# Altium integrated library ADLib_GoodToUse.IntLib: 276 symbols (part 1 of 2) (continued)
## SBD_SOD323
designator D?, comment SBD
Schottky Diode; Mfr_Name: Mfr?; Package: SOD323; PartNumber: SBD
footprint SOD-323_L1.7-W1.3-RD
pins: 1, 2

## TVS_0603_BD
designator D?, comment TVS
TVS Diode Bidirectional; Mfr_Name: Mfr?; Package: 0603; PartNumber: TVS
footprint L0603
pins: 1 A, 2 K

## TVS_Diode_BD
designator D?, comment TVS
TVS Diode Bidirectional; Mfr_Name: Mfr?; Package: PkgRef; PartNumber: TVS
footprint DO-214AA_L5.3-W3.6-RD (SMB)
pins: 1 A, 2 K

## TVS_Diode_UD
designator D?, comment TVS
TVS Diode Uni-directional; Mfr_Name: Mfr?; Package: PkgRef; PartNumber: TVS
footprint DO-214AA_L5.3-W3.6-RD (SMB)
pins: 1, 2


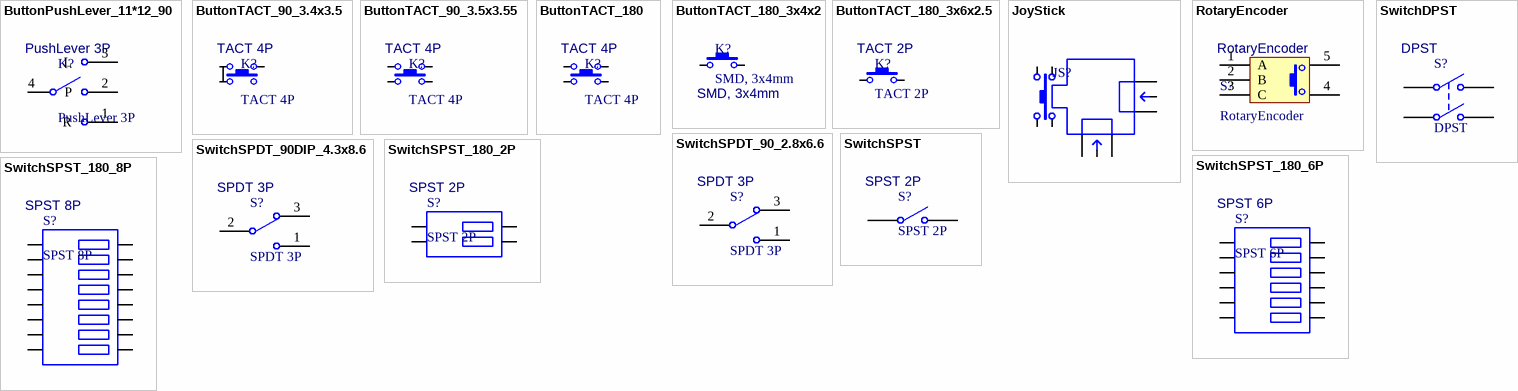
[diagram p6: symbols ButtonPushLever_11*12_90 to SwitchSPST_180_8P]

## ButtonPushLever_11*12_90
designator K?, comment PushLever 3P
Button; type: PushLever 3P; PartNumber: PushLever 3P
footprint ButtonPushLever_11*12_90
pins: 1 R  , 2 P  , 3 L  , 4

## ButtonTACT_90_3.4x3.5
designator K?, comment TACT 4P
Button; type: TACT 4P; Link: *; PartNumber: TACT 4P
footprint ButtonTACT_3.4*3.5_90
pins: 1, 2, 3

## ButtonTACT_90_3.5x3.55
designator K?, comment TACT 4P
Button; type: TACT 4P; Link: *; PartNumber: TACT 4P
footprint ButtonTACT_3.5*3.55_90
pins: 1, 2, 3, 4

## ButtonTACT_180
designator K?, comment TACT 4P
Button; type: TACT 4P; PartNumber: TACT 4P
footprint ButtonTACT_4P_3x4x2_180
pins: 1, 2, 3, 4

## ButtonTACT_180_3x4x2
designator K?, comment SMD, 3x4mm
Button; type: SMD, 3x4mm; MFR: SMD, 3x4mm; PartNumber: SMD, 3x4mm
footprint ButtonTACT_3x4x2_180
footprint ButtonTACT_3x4x2_180H
pins: 1, 2

## ButtonTACT_180_3x6x2.5
designator K?, comment TACT 2P
Button; type: TACT 2P; PartNumber: TACT 2P
footprint ButtonTACT_3x6x2.5_180
pins: 1, 2

## JoyStick
designator JS?
JoyStick; Package: *
footprint JoyStick
pins: 1, 2, 3, 4, 5, 6, 7, 8, 9, 10

## RotaryEncoder
designator S?
Encoder; Package: RotaryEncoder; PartNumber: RotaryEncoder
footprint RotaryEncoder
pins: 1 A, 2 B, 3 C, 4, 5

## SwitchDPST
designator S?, comment DPST
Switch; Package: DPST; PartNumber: DPST
footprint DPST-4 (Switch; 4 Leads)
pins: 1 COMMON1, 2 NO1, 3 COMMON2, 4 NO2

## SwitchSPDT_90_2.8x6.6
designator S?, comment SPDT 3P
Switch; Package: SPDT 3P; Link: *; PartNumber: SPDT 3P
footprint SwitchSPDT_2.8X6.6_90
pins: 1, 2, 3

## SwitchSPDT_90DIP_4.3x8.6
designator S?, comment SPDT 3P
Switch; Package: SPDT 3P; PartNumber: SPDT 3P
footprint SwitchSPDT_4.3X8.6_D90
pins: 1, 2, 3

## SwitchSPST
designator S?, comment SPST 2P
Switch; Package: SPST 2P; PartNumber: SPST 2P
footprint SPST-2 (Switch; 2 Leads)
pins: 1 COMMON, 2 NO

## SwitchSPST_180_2P
designator S?, comment SPST 2P
Switch; Package: SPST 2P; PartNumber: SPST 2P
footprint SwitchSPDT_P2_180
pins: 1 COMMON, 1ON ON, 2 COMMON, 2ON NO

## SwitchSPST_180_6P
designator S?, comment SPST 6P
Switch; Package: SPST 6P; PartNumber: SPST 6P
footprint SwitchSPDT_P6_180
pins: 1 COMMON, 1ON ON, 2 COMMON, 2ON NO, 3 COMMON, 3ON NO, 4 COMMON, 4ON NO, 5 COMMON, 5ON NO, 6 COMMON, 6ON NO

## SwitchSPST_180_8P
designator S?, comment SPST 8P
Switch; Package: SPST 8P; PartNumber: SPST 8P
footprint SwitchSPDT_P8_180
pins: 1 COMMON, 1ON ON, 2 COMMON, 2ON NO, 3 COMMON, 3ON NO, 4 COMMON, 4ON NO, 5 COMMON, 5ON NO, 6 COMMON, 6ON NO, 7 COMMON, 7ON NO, 8 COMMON, 8ON NO


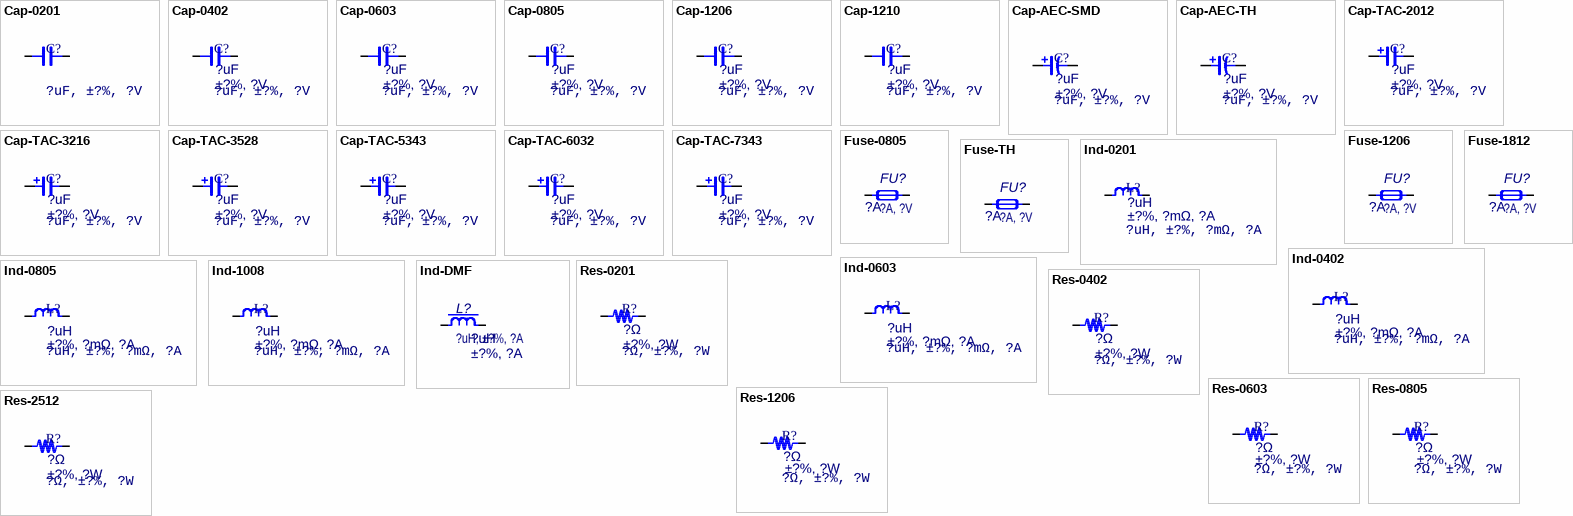
[diagram p7: symbols Cap-0201 to Res-2512]

## Cap-0201
designator C?, comment ?uF, ±?%, ?V
Capacitor; MFR: Mfr?; PartNumber: C0201; Note: ±?%, ?V; Package: 0201; Value: ?uF
footprint C0201
pins: 1, 2

## Cap-0402
designator C?, comment ?uF, ±?%, ?V  value ?uF  Note: ±?%, ?V
Capacitor; MFR: Mfr?; PartNumber: C0402; Package: 0402
footprint C0402
pins: 1, 2

## Cap-0603
designator C?, comment ?uF, ±?%, ?V  value ?uF  Note: ±?%, ?V
Capacitor; MFR: Mfr?; PartNumber: C0603; Package: 0603
footprint C0603
pins: 1, 2

## Cap-0805
designator C?, comment ?uF, ±?%, ?V  value ?uF  Note: ±?%, ?V
Capacitor; MFR: Mfr?; PartNumber: C0805; Package: 0805
footprint C0805
pins: 1, 2

## Cap-1206
designator C?, comment ?uF, ±?%, ?V  value ?uF  Note: ±?%, ?V
Capacitor; MFR: Mfr?; PartNumber: C1206; Package: 1206
footprint C1206
pins: 1, 2

## Cap-1210
designator C?, comment ?uF, ±?%, ?V  value ?uF  Note: ±?%, ?V
Capacitor; MFR: Mfr?; PartNumber: C1210; Package: 1210
footprint C1210
pins: 1, 2

## Cap-AEC-SMD
designator C?, comment ?uF, ±?%, ?V  value ?uF  Note: ±?%, ?V
Capacitor AEC; MFR: Mfr?; Package: AEC-SMD; PartNumber: AEC
footprint AEC-SMD_BD3.0-L3.3-W3.3-FD (贴片电解电容，直径3mm，高5.4mm)
footprint AEC-SMD_BD4.0-L4.3-W4.3-FD (贴片电解电容，直径4mm，高5.4mm)
footprint AEC-SMD_BD5.0-L5.3-W5.3-FD (贴片电解电容，直径5mm，高5.4mm)
footprint AEC-SMD_BD6.3-L6.6-W6.6-FD
footprint AEC-SMD_BD8.0-L8.3-W8.3-FD (贴片电解电容，直径8mm，高6.2mm)
footprint AEC-SMD_BD10.0-L10.3-W10.3-FD (贴片电解电容，直径10mm，高10.2mm)
footprint AEC-SMD_BD12.5-L13.0-W13.0-FD (贴片电解电容，直径12.5mm，高13.5mm)
footprint AEC-SMD_BD16.0-L17.0-W17.0-FD (贴片电解电容，直径16mm，高16.5mm)
pins: 1, 2

## Cap-AEC-TH
designator C?, comment ?uF, ±?%, ?V  value ?uF  Note: ±?%, ?V
Capacitor AEC; MFR: Mfr?; Package: AEC-SMD; PartNumber: AEC
footprint AEC-TH_BD4.0-P1.50-FD (脚距1.5mm直径4mm高度8mm)
pins: 1, 2

## Cap-TAC-2012
designator C?, comment ?uF, ±?%, ?V  value ?uF  Note: ±?%, ?V
Capacitor Tantalum; MFR: Mfr?; PartNumber: TAC0805; Package: 0805
footprint TAC-SMD_2012-FD_0805
pins: 1, 2

## Cap-TAC-3216
designator C?, comment ?uF, ±?%, ?V  value ?uF  Note: ±?%, ?V
Capacitor Tantalum; MFR: Mfr?; PartNumber: TAC1210; Package: 1210
footprint TAC-SMD_3216-FD_1206
pins: 1, 2

## Cap-TAC-3528
designator C?, comment ?uF, ±?%, ?V  value ?uF  Note: ±?%, ?V
Capacitor Tantalum; MFR: Mfr?; PartNumber: TAC1206; Package: 1206
footprint TAC-SMD_3528-FD_1210
pins: 1, 2

## Cap-TAC-5343
designator C?, comment ?uF, ±?%, ?V  value ?uF  Note: ±?%, ?V
Capacitor Tantalum; MFR: Mfr?; PartNumber: TAC2917; Package: 2917
footprint TAC-SMD_5343 (长7.3mm，宽4.3mm，厚2.8mm)
pins: 1, 2

## Cap-TAC-6032
designator C?, comment ?uF, ±?%, ?V  value ?uF  Note: ±?%, ?V
Capacitor Tantalum; MFR: Mfr?; PartNumber: TAC2917; Package: 2917
footprint TAC-SMD_6032 (长6.0mm，宽3.2mm，厚2.5mm)
pins: 1, 2

## Cap-TAC-7343
designator C?, comment ?uF, ±?%, ?V  value ?uF  Note: ±?%, ?V
Capacitor Tantalum; MFR: Mfr?; PartNumber: TAC2917; Package: 2917
footprint TAC-SMD_7343-FD_2917
pins: 1, 2

## Fuse-0805
designator FU?, comment ?A, ?V  value ?A
Self recovery fuse PPTC; MFR: Mfr?; PartNumber: FU0805; Package: 0805; Note: ?V
footprint F0805
pins: 1, 2

## Fuse-1206
designator FU?, comment ?A, ?V  value ?A
Self recovery fuse PPTC; MFR: Mfr?; PartNumber: FU1206; Package: 1206; Note: ?V
footprint F1206
pins: 1, 2

## Fuse-1812
designator FU?, comment ?A, ?V  value ?A
Self recovery fuse PPTC; MFR: Mfr?; PartNumber: FU1812; Package: 1812; Note: ?V
footprint F1812
pins: 1, 2

## Fuse-TH
designator FU?, comment ?A, ?V  value ?A
Self recovery fuse PPTC; MFR: Mfr?; PartNumber: FU; Package: DIPx2; Note: ?V
footprint FUSE-TH_L16.0-W4.0-P6.0-V (4*16mm(直径，脚距）)
pins: 1, 2

## Ind-0201
designator L?, comment ?uH, ±?%, ?mΩ, ?A  value ?uH  Note: ±?%, ?mΩ, ?A
Inductor; MFR: Mfr?; PartNumber: L0201; Package: 0201
pins: 1, 2

## Ind-0402
designator L?, comment ?uH, ±?%, ?mΩ, ?A  value ?uH  Note: ±?%, ?mΩ, ?A
Inductor; MFR: Mfr?; PartNumber: L0402; Package: 0402
footprint L0402
pins: 1, 2

## Ind-0603
designator L?, comment ?uH, ±?%, ?mΩ, ?A  value ?uH  Note: ±?%, ?mΩ, ?A
Inductor; MFR: Mfr?; PartNumber: L0603; Package: 0603
footprint L0603
pins: 1, 2

## Ind-0805
designator L?, comment ?uH, ±?%, ?mΩ, ?A  value ?uH  Note: ±?%, ?mΩ, ?A
Inductor; MFR: Mfr?; PartNumber: L0805; Package: 0805
footprint L0805
pins: 1, 2

## Ind-1008
designator L?, comment ?uH, ±?%, ?mΩ, ?A  value ?uH  Note: ±?%, ?mΩ, ?A
Inductor; MFR: Mfr?; PartNumber: L1008; Package: 1008
pins: 1, 2

## Ind-DMF
designator L?, comment ?uH, ±?%, ?A  value ?uH  Note: ±?%, ?A
Differential mode filtering inductance; MFR: Mfr?; PartNumber: L; Package: pkg?
footprint IND-SMD_L4.0-W4.0_NR4010 (4.0mm*4.0mm*1.0mm(长*宽*高）)
pins: 1, 2

## Res-0201
designator R?, comment ?Ω, ±?%, ?W  value ?Ω  Note: ±?%, ?W
Resistor; MFR: Mfr?; PartNumber: R0201; Package: 0201
pins: 1, 2

## Res-0402
designator R?, comment ?Ω, ±?%, ?W  value ?Ω  Note: ±?%, ?W
Resistor; MFR: Mfr?; PartNumber: R0402; Package: 0402
footprint R0402
pins: 1, 2

## Res-0603
designator R?, comment ?Ω, ±?%, ?W  value ?Ω  Note: ±?%, ?W
Resistor; MFR: Mfr?; PartNumber: R0603; Package: 0603
footprint R0603
pins: 1, 2

## Res-0805
designator R?, comment ?Ω, ±?%, ?W  value ?Ω  Note: ±?%, ?W
Resistor; MFR: Mfr?; PartNumber: R0805; Package: 0805
footprint R0805
pins: 1, 2

## Res-1206
designator R?, comment ?Ω, ±?%, ?W  value ?Ω  Note: ±?%, ?W
Resistor; MFR: Mfr?; PartNumber: R1206; Package: 1206
footprint R1206
pins: 1, 2

## Res-2512
designator R?, comment ?Ω, ±?%, ?W  value ?Ω  Note: ±?%, ?W
Resistor; MFR: Mfr?; PartNumber: R2512; Package: 2512
footprint R2512
pins: 1, 2


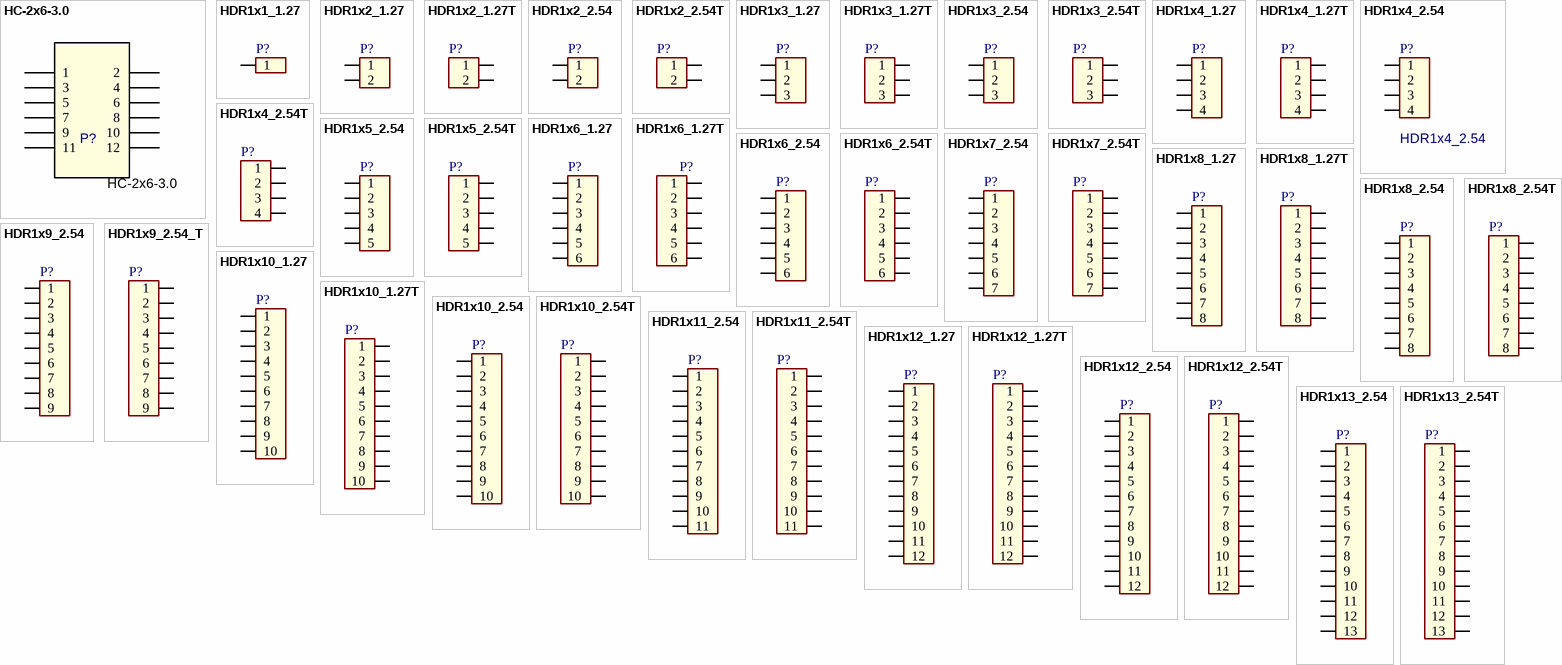
[diagram p8: symbols HC-2x6-3.0 to HDR1x13_2.54T]

## HC-2x6-3.0
designator P?
Header; MFR: Mfr?; Package: HC-2x6-3.0; PartNumber: HC-2x6-3.0
footprint MX-TH_2X6P-P3.0_MX3.0-2X6AW
pins: 1, 2, 3, 4, 5, 6, 7, 8, 9, 10, 11, 12

## HDR1x1_1.27
designator P?, comment HDR1x1  (value not drawn)
Header; PartNumber: HDR1x1_1.27; Package: HDR1x1_1.27
footprint HDR-TH-1P-P1.27-V
pins: 1

## HDR1x2_1.27
designator P?, comment HDR1x2  (value not drawn)
Header; PartNumber: HDR1x2_1.27; Package: HDR1x2_1.27
footprint HDR-TH-1X2P-P2.54-H
footprint HDR-TH-1X2P-P1.27-V
pins: 1, 2

## HDR1x2_1.27T
designator P?, comment HDR1x2  (value not drawn)
Header; PartNumber: HDR1x2_1.27T; Package: HDR1x2_1.27T
footprint HDR1X2_1.27_180
footprint HDR1X2_1.27_180H
pins: 1, 2

## HDR1x2_2.54
designator P?, comment HDR1x2  (value not drawn)
Header; PartNumber: HDR1x2_2.54; Package: HDR1x2_2.54
footprint HDR1X2_2.54_90
footprint HDR1X2_2.54_90F
footprint HDR1X2_2.54_180
footprint HDR1X2_2.54_180F
footprint HDR1X2_2.54_180H
footprint HDR1X2_2.54_180HD
pins: 1, 2

## HDR1x2_2.54T
designator P?, comment HDR1x2  (value not drawn)
Header; PartNumber: HDR1x2_2.54T; Package: HDR1x2_2.54T
footprint HDR1X2_2.54_90
footprint HDR1X2_2.54_90F
footprint HDR1X2_2.54_180
footprint HDR1X2_2.54_180F
footprint HDR1X2_2.54_180H
footprint HDR1X2_2.54_180HD
pins: 1, 2

## HDR1x3_1.27
designator P?, comment HDR1x3  (value not drawn)
Header; PartNumber: HDR1x3_1.27; Package: HDR1x3_1.27
footprint HDR1X3_1.27_180HF
pins: 1, 2, 3

## HDR1x3_1.27T
designator P?, comment HDR1x3  (value not drawn)
Header; PartNumber: HDR1x3_1.27T; Package: HDR1x3_1.27T
footprint HDR1X3_1.27_180 (Footprint not found)
footprint HDR1X3_1.27_180HF
pins: 1, 2, 3

## HDR1x3_2.54
designator P?, comment HDR1x3  (value not drawn)
Header; PartNumber: HDR1x3_2.54; Package: HDR1x3_2.54
footprint HDR1X3_2.54_90
footprint HDR1X3_2.54_90F
footprint HDR1X3_2.54_180
footprint HDR1X3_2.54_180F
pins: 1, 2, 3

## HDR1x3_2.54T
designator P?, comment HDR1x3  (value not drawn)
Header; PartNumber: HDR1x3_2.54T; Package: HDR1x3_2.54T
footprint HDR1X3_2.54_90
footprint HDR1X3_2.54_90F
footprint HDR1X3_2.54_180
footprint HDR1X3_2.54_180F
pins: 1, 2, 3

## HDR1x4_1.27
designator P?, comment HDR1x4  (value not drawn)
Header; PartNumber: HDR1x4_1.27; Package: HDR1x4_1.27
footprint HDR1X4_1.27_180
footprint HDR1X4_1.27_180F
footprint HDR1X4_1.27_180H
footprint HDR1X4_1.27_180HF
pins: 1, 2, 3, 4

## HDR1x4_1.27T
designator P?, comment HDR1x4  (value not drawn)
Header; PartNumber: HDR1x4_1.27T; Package: HDR1x4_1.27T
footprint HDR1X4_1.27_180
footprint HDR1X4_1.27_180F
footprint HDR1X4_1.27_180H
footprint HDR1X4_1.27_180HF
pins: 1, 2, 3, 4

## HDR1x4_2.54
designator P?, comment PartNumber: HDR1x4_2.54  (hidden comment: HDR1x4)
Header; Package: HDR1x4_2.54
footprint HDR1X4_2.54_90
footprint HDR1X4_2.54_90F
footprint HDR1x4_2.54_180
footprint HDR1X4_2.54_180F (Footprint not found)
footprint HDR1X4_2.54_180H
pins: 1, 2, 3, 4

## HDR1x4_2.54T
designator P?, comment HDR1x4  (value not drawn)
Header; PartNumber: HDR1x4_2.54T; Package: HDR1x4_2.54T
footprint HDR1X4_2.54_90
footprint HDR1X4_2.54_90F
footprint HDR1x4_2.54_180
footprint HDR1X4_2.54_180F (Footprint not found)
footprint HDR1X4_2.54_180H
pins: 1, 2, 3, 4

## HDR1x5_2.54
designator P?, comment HDR1x5  (value not drawn)
Header; PartNumber: HDR1x5_2.54; Package: HDR1x5_2.54
footprint HDR1X5_2.54_180
footprint HDR1X5_2.54_180F (Footprint not found)
footprint HDR1X5_2.54_180H
footprint HDR1X5_2.54_180HF
pins: 1, 2, 3, 4, 5

## HDR1x5_2.54T
designator P?, comment HDR1x5  (value not drawn)
Header; PartNumber: HDR1x5_2.54T; Package: HDR1x5_2.54T
footprint HDR1X5_2.54_90 (Footprint not found)
footprint HDR1X5_2.54_90F (Footprint not found)
footprint HDR1X5_2.54_180
footprint HDR1X5_2.54_180F (Footprint not found)
footprint HDR1X5_2.54_180H
footprint HDR1X5_2.54_180HF
pins: 1, 2, 3, 4, 5

## HDR1x6_1.27
designator P?, comment HDR1x6  (value not drawn)
Header; PartNumber: HDR1x6_1.27; Package: HDR1x6_1.27
footprint HDR1X6_1.27_90 (Footprint not found)
footprint HDR1X6_1.27_90F (Footprint not found)
footprint HDR1X6_1.27_180 (Footprint not found)
footprint HDR1X6_1.27_180F
footprint HDR1X6_1.27_180H
footprint HDR1X6_1.27_180HF
pins: 1, 2, 3, 4, 5, 6

## HDR1x6_1.27T
designator P?, comment HDR1x6  (value not drawn)
Header; PartNumber: HDR1x6_1.27T; Package: HDR1x6_1.27T
footprint HDR1X6_1.27_90 (Footprint not found)
footprint HDR1X6_1.27_90F (Footprint not found)
footprint HDR1X6_1.27_180 (Footprint not found)
footprint HDR1X6_1.27_180F
footprint HDR1X6_1.27_180H
footprint HDR1X6_1.27_180HF
pins: 1, 2, 3, 4, 5, 6

## HDR1x6_2.54
designator P?, comment HDR1x6  (value not drawn)
Header; PartNumber: HDR1x6_2.54; Package: HDR1x6_2.54
footprint HDR1X6_2.54_90
footprint HDR1X6_2.54_90F
footprint HDR1X6_2.54_180
footprint HDR1X6_2.54_180F
pins: 1, 2, 3, 4, 5, 6

## HDR1x6_2.54T
designator P?, comment HDR1x6  (value not drawn)
Header; PartNumber: HDR1x6_2.54T; Package: HDR1x6_2.54T
footprint HDR1X6_2.54_90
footprint HDR1X6_2.54_90F
footprint HDR1X6_2.54_180
footprint HDR1X6_2.54_180F
pins: 1, 2, 3, 4, 5, 6

## HDR1x7_2.54
designator P?, comment HDR1x7  (value not drawn)
Header; PartNumber: HDR1x7_2.54; Package: HDR1x7_2.54
footprint HDR1X7_2.54_90 (Footprint not found)
footprint HDR1X7_2.54_90F (Footprint not found)
footprint HDR1X7_2.54_180
footprint HDR1X7_2.54_180F (Footprint not found)
footprint HDR1X7_2.54_180H
pins: 1, 2, 3, 4, 5, 6, 7

## HDR1x7_2.54T
designator P?, comment HDR1x7  (value not drawn)
Header; PartNumber: HDR1x7_2.54T; Package: HDR1x7_2.54T
footprint HDR1X7_2.54_90 (Footprint not found)
footprint HDR1X7_2.54_90F (Footprint not found)
footprint HDR1X7_2.54_180
footprint HDR1X7_2.54_180F (Footprint not found)
footprint HDR1X7_2.54_180H
pins: 1, 2, 3, 4, 5, 6, 7

## HDR1x8_1.27
designator P?, comment HDR1x8  (value not drawn)
Header; PartNumber: HDR1x8_1.27; Package: HDR1x8_1.27
footprint HDR1X8_1.27_90 (Footprint not found)
footprint HDR1X8_1.27_90F (Footprint not found)
footprint HDR1X8_1.27_180
footprint HDR1X8_1.27_180F
footprint HDR1X8_1.27_180H (Footprint not found)
footprint HDR1X8_1.27_180HF
pins: 1, 2, 3, 4, 5, 6, 7, 8

## HDR1x8_1.27T
designator P?, comment HDR1x8  (value not drawn)
Header; PartNumber: HDR1x8_1.27T; Package: HDR1x8_1.27T
footprint HDR1X8_1.27_90 (Footprint not found)
footprint HDR1X8_1.27_90F (Footprint not found)
footprint HDR1X8_1.27_180
footprint HDR1X8_1.27_180F
footprint HDR1X8_1.27_180H (Footprint not found)
footprint HDR1X8_1.27_180HF
pins: 1, 2, 3, 4, 5, 6, 7, 8

## HDR1x8_2.54
designator P?, comment HDR1x8  (value not drawn)
Header; PartNumber: HDR1x8_2.54; Package: HDR1x8_2.54
footprint HDR1X8_2.54_90 (Footprint not found)
footprint HDR1X8_2.54_90F (Footprint not found)
footprint HDR1X8_2.54_180
footprint HDR1X8_2.54_180F
footprint HDR1X8_2.54_180S
pins: 1, 2, 3, 4, 5, 6, 7, 8

## HDR1x8_2.54T
designator P?, comment HDR1x8  (value not drawn)
Header; PartNumber: HDR1x8_2.54T; Package: HDR1x8_2.54T
footprint HDR1X8_2.54_90 (Footprint not found)
footprint HDR1X8_2.54_90F (Footprint not found)
footprint HDR1X8_2.54_180
footprint HDR1X8_2.54_180F
footprint HDR1X8_2.54_180S
pins: 1, 2, 3, 4, 5, 6, 7, 8

## HDR1x9_2.54
designator P?, comment HDR1x9  (value not drawn)
Header; PartNumber: HDR1x9_2.54; Package: HDR1x9_2.54
footprint HDR1X9_2.54_90 (Footprint not found)
footprint HDR1X9_2.54_90F (Footprint not found)
footprint HDR1X9_2.54_180
footprint HDR1X9_2.54_180F (Footprint not found)
pins: 1, 2, 3, 4, 5, 6, 7, 8, 9

## HDR1x9_2.54_T
designator P?, comment HDR1x9  (value not drawn)
Header; PartNumber: HDR1x9_2.54_T; Package: HDR1x9_2.54_T
footprint HDR1X9_2.54_90 (Footprint not found)
footprint HDR1X9_2.54_90F (Footprint not found)
footprint HDR1X9_2.54_180
footprint HDR1X9_2.54_180F (Footprint not found)
pins: 1, 2, 3, 4, 5, 6, 7, 8, 9

## HDR1x10_1.27
designator P?, comment HDR1x10  (value not drawn)
Header; PartNumber: HDR1x10_1.27; Package: HDR1x10_1.27
footprint HDR1X10_1.27_90 (Footprint not found)
footprint HDR1X10_1.27_90F (Footprint not found)
footprint HDR1X10_1.27_180
footprint HDR1X10_1.27_180F (Footprint not found)
footprint HDR1X10_1.27_180H (Footprint not found)
footprint HDR1X10_1.27_180HF
pins: 1, 2, 3, 4, 5, 6, 7, 8, 9, 10

## HDR1x10_1.27T
designator P?, comment HDR1x10  (value not drawn)
Header; PartNumber: HDR1x10_1.27T; Package: HDR1x10_1.27T
footprint HDR1X10_1.27_90 (Footprint not found)
footprint HDR1X10_1.27_90F (Footprint not found)
footprint HDR1X10_1.27_180
footprint HDR1X10_1.27_180F (Footprint not found)
footprint HDR1X10_1.27_180H (Footprint not found)
footprint HDR1X10_1.27_180HF
pins: 1, 2, 3, 4, 5, 6, 7, 8, 9, 10

## HDR1x10_2.54
designator P?, comment HDR1x10  (value not drawn)
Header; PartNumber: HDR1x10_2.54; Package: HDR1x10_2.54
footprint HDR1X10_2.54_90
footprint HDR1X10_2.54_90F (Footprint not found)
footprint HDR1X10_2.54_180
footprint HDR1X10_2.54_180F
footprint HDR1X10_2.54_180H
pins: 1, 2, 3, 4, 5, 6, 7, 8, 9, 10

## HDR1x10_2.54T
designator P?, comment HDR1x10  (value not drawn)
Header; PartNumber: HDR1x10_2.54T; Package: HDR1x10_2.54T
footprint HDR1X10_2.54_90
footprint HDR1X10_2.54_90F (Footprint not found)
footprint HDR1X10_2.54_180
footprint HDR1X10_2.54_180F
footprint HDR1X10_2.54_180H
pins: 1, 2, 3, 4, 5, 6, 7, 8, 9, 10

## HDR1x11_2.54
designator P?, comment HDR1x11  (value not drawn)
Header; PartNumber: HDR1x11_2.54; Package: HDR1x11_2.54
footprint HDR1X11_2.54_90 (Footprint not found)
footprint HDR1X11_2.54_90F (Footprint not found)
footprint HDR1X11_2.54_180
footprint HDR1X11_2.54_180F (Footprint not found)
pins: 1, 2, 3, 4, 5, 6, 7, 8, 9, 10, 11

## HDR1x11_2.54T
designator P?, comment HDR1x11  (value not drawn)
Header; PartNumber: HDR1x11_2.54T; Package: HDR1x11_2.54T
footprint HDR1X11_2.54_90 (Footprint not found)
footprint HDR1X11_2.54_90F (Footprint not found)
footprint HDR1X11_2.54_180
footprint HDR1X11_2.54_180F (Footprint not found)
pins: 1, 2, 3, 4, 5, 6, 7, 8, 9, 10, 11

## HDR1x12_1.27
designator P?, comment HDR1x12  (value not drawn)
Header; PartNumber: HDR1x12_1.27; Package: HDR1x12_1.27
footprint HDR1X12_1.27_90 (Footprint not found)
footprint HDR1X12_1.27_90F (Footprint not found)
footprint HDR1X12_1.27_180
footprint HDR1X12_1.27_180F (Footprint not found)
footprint HDR1X12_1.27_180H (Footprint not found)
footprint HDR1X12_1.27_180HF (Footprint not found)
pins: 1, 2, 3, 4, 5, 6, 7, 8, 9, 10, 11, 12

## HDR1x12_1.27T
designator P?, comment HDR1x12  (value not drawn)
Header; PartNumber: HDR1x12_1.27T; Package: HDR1x12_1.27T
footprint HDR1X12_1.27_90 (Footprint not found)
footprint HDR1X12_1.27_90F (Footprint not found)
footprint HDR1X12_1.27_180
footprint HDR1X12_1.27_180F (Footprint not found)
footprint HDR1X12_1.27_180H (Footprint not found)
footprint HDR1X12_1.27_180HF (Footprint not found)
pins: 1, 2, 3, 4, 5, 6, 7, 8, 9, 10, 11, 12

## HDR1x12_2.54
designator P?, comment HDR1x12  (value not drawn)
Header; PartNumber: HDR1x12_2.54; Package: HDR1x12_2.54
footprint HDR1X12_2.54_90
footprint HDR1X12_2.54_90F (Footprint not found)
footprint HDR1X12_2.54_180
footprint HDR1X12_2.54_180F (Footprint not found)
footprint HDR1X12_2.54_180H
pins: 1, 2, 3, 4, 5, 6, 7, 8, 9, 10, 11, 12

## HDR1x12_2.54T
designator P?, comment HDR1x12  (value not drawn)
Header; PartNumber: HDR1x12_2.54T; Package: HDR1x12_2.54T
footprint HDR1X12_2.54_90
footprint HDR1X12_2.54_90F (Footprint not found)
footprint HDR1X12_2.54_180
footprint HDR1X12_2.54_180F (Footprint not found)
footprint HDR1X12_2.54_180H
pins: 1, 2, 3, 4, 5, 6, 7, 8, 9, 10, 11, 12

## HDR1x13_2.54
designator P?, comment HDR1x13  (value not drawn)
Header; PartNumber: HDR1x13_2.54; Package: HDR1x13_2.54
footprint HDR1X13_2.54_90 (Footprint not found)
footprint HDR1X13_2.54_90F (Footprint not found)
footprint HDR1X13_2.54_180
footprint HDR1X13_2.54_180F (Footprint not found)
pins: 1, 2, 3, 4, 5, 6, 7, 8, 9, 10, 11, 12, 13

## HDR1x13_2.54T
designator P?, comment HDR1x13  (value not drawn)
Header; PartNumber: HDR1x13_2.54T; Package: HDR1x13_2.54T
footprint HDR1X13_2.54_90 (Footprint not found)
footprint HDR1X13_2.54_90F (Footprint not found)
footprint HDR1X13_2.54_180
footprint HDR1X13_2.54_180F (Footprint not found)
pins: 1, 2, 3, 4, 5, 6, 7, 8, 9, 10, 11, 12, 13

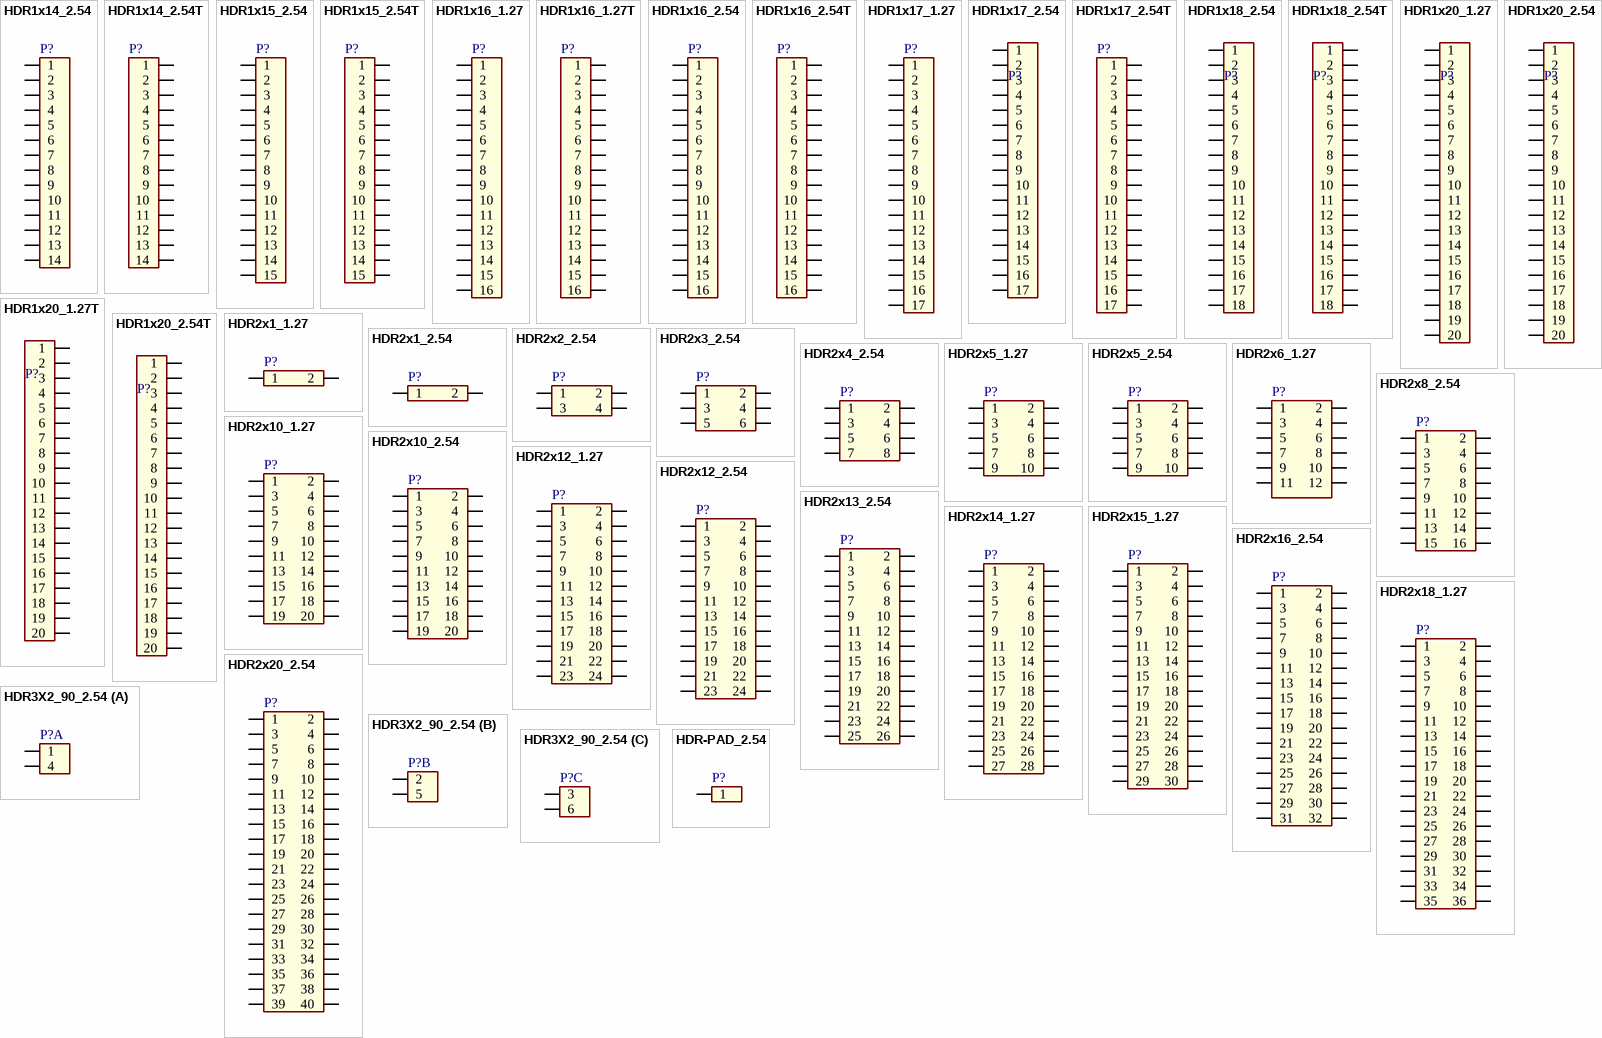
[diagram p9: symbols HDR1x14_2.54 to HDR-PAD_2.54]

## HDR1x14_2.54
designator P?, comment HDR1x14  (value not drawn)
Header; PartNumber: HDR1x14_2.54; Package: HDR1x14_2.54
footprint HDR1X14_2.54_90 (Footprint not found)
footprint HDR1X14_2.54_90F (Footprint not found)
footprint HDR1X14_2.54_180
footprint HDR1X14_2.54_180F (Footprint not found)
footprint HDR1X14_2.54_180S
pins: 1, 2, 3, 4, 5, 6, 7, 8, 9, 10, 11, 12, 13, 14

## HDR1x14_2.54T
designator P?, comment HDR1x14  (value not drawn)
Header; PartNumber: HDR1x14_2.54T; Package: HDR1x14_2.54T
footprint HDR1X14_2.54_90 (Footprint not found)
footprint HDR1X14_2.54_90F (Footprint not found)
footprint HDR1X14_2.54_180
footprint HDR1X14_2.54_180F (Footprint not found)
footprint HDR1X14_2.54_180S
pins: 1, 2, 3, 4, 5, 6, 7, 8, 9, 10, 11, 12, 13, 14

## HDR1x15_2.54
designator P?, comment HDR1x15  (value not drawn)
Header; PartNumber: HDR1x15_2.54; Package: HDR1x15_2.54
footprint HDR1X15_2.54_90 (Footprint not found)
footprint HDR1X15_2.54_90F (Footprint not found)
footprint HDR1X15_2.54_180
footprint HDR1X15_2.54_180F (Footprint not found)
pins: 1, 2, 3, 4, 5, 6, 7, 8, 9, 10, 11, 12, 13, 14, 15

## HDR1x15_2.54T
designator P?, comment HDR1x15  (value not drawn)
Header; PartNumber: HDR1x15_2.54T; Package: HDR1x15_2.54T
footprint HDR1X15_2.54_90 (Footprint not found)
footprint HDR1X15_2.54_90F (Footprint not found)
footprint HDR1X15_2.54_180
footprint HDR1X15_2.54_180F (Footprint not found)
pins: 1, 2, 3, 4, 5, 6, 7, 8, 9, 10, 11, 12, 13, 14, 15

## HDR1x16_1.27
designator P?, comment HDR1x16  (value not drawn)
Header; PartNumber: HDR1x16_1.27; Package: HDR1x16_1.27
footprint HDR1X16_1.27_90 (Footprint not found)
footprint HDR1X16_1.27_90F (Footprint not found)
footprint HDR1X16_1.27_180
footprint HDR1X16_1.27_180F (Footprint not found)
pins: 1, 2, 3, 4, 5, 6, 7, 8, 9, 10, 11, 12, 13, 14, 15, 16

## HDR1x16_1.27T
designator P?, comment HDR1x16  (value not drawn)
Header; PartNumber: HDR1x16_1.27T; Package: HDR1x16_1.27T
footprint HDR1X16_1.27_90 (Footprint not found)
footprint HDR1X16_1.27_90F (Footprint not found)
footprint HDR1X16_1.27_180
footprint HDR1X16_1.27_180F (Footprint not found)
pins: 1, 2, 3, 4, 5, 6, 7, 8, 9, 10, 11, 12, 13, 14, 15, 16

## HDR1x16_2.54
designator P?, comment HDR1x16  (value not drawn)
Header; PartNumber: HDR1x16_2.54; Package: HDR1x16_2.54
footprint HDR1X16_2.54_90 (Footprint not found)
footprint HDR1X16_2.54_90F (Footprint not found)
footprint HDR1X16_2.54_180
footprint HDR1X16_2.54_180F (Footprint not found)
pins: 1, 2, 3, 4, 5, 6, 7, 8, 9, 10, 11, 12, 13, 14, 15, 16

## HDR1x16_2.54T
designator P?, comment HDR1x16  (value not drawn)
Header; PartNumber: HDR1x16_2.54T; Package: HDR1x16_2.54T
footprint HDR1X16_2.54_90 (Footprint not found)
footprint HDR1X16_2.54_90F (Footprint not found)
footprint HDR1X16_2.54_180
footprint HDR1X16_2.54_180F (Footprint not found)
pins: 1, 2, 3, 4, 5, 6, 7, 8, 9, 10, 11, 12, 13, 14, 15, 16

## HDR1x17_1.27
designator P?, comment HDR1x17  (value not drawn)
Header; PartNumber: HDR1x17_1.27; Package: HDR1x17_1.27
footprint HDR1X15_2.54_90 (Footprint not found)
footprint HDR1X15_2.54_90F (Footprint not found)
footprint HDR1X17_1.27_180
footprint HDR1X15_2.54_180F (Footprint not found)
pins: 1, 2, 3, 4, 5, 6, 7, 8, 9, 10, 11, 12, 13, 14, 15, 16, 17

## HDR1x17_2.54
designator P?, comment HDR1x17  (value not drawn)
Header; PartNumber: HDR1x17_2.54; Package: HDR1x17_2.54
footprint HDR1X17_2.54_90 (Footprint not found)
footprint HDR1X17_2.54_90F (Footprint not found)
footprint HDR1X17_2.54_180
footprint HDR1X17_2.54_180F (Footprint not found)
pins: 1, 2, 3, 4, 5, 6, 7, 8, 9, 10, 11, 12, 13, 14, 15, 16, 17

## HDR1x17_2.54T
designator P?, comment HDR1x17  (value not drawn)
Header; PartNumber: HDR1x17_2.54T; Package: HDR1x17_2.54T
footprint HDR1X17_2.54_90 (Footprint not found)
footprint HDR1X17_2.54_90F (Footprint not found)
footprint HDR1X17_2.54_180
footprint HDR1X17_2.54_180F (Footprint not found)
pins: 1, 2, 3, 4, 5, 6, 7, 8, 9, 10, 11, 12, 13, 14, 15, 16, 17

## HDR1x18_2.54
designator P?, comment HDR1x18  (value not drawn)
Header; PartNumber: HDR1x18_2.54; Package: HDR1x18_2.54
footprint HDR1X18_2.54_90 (Footprint not found)
footprint HDR1X18_2.54_90F (Footprint not found)
footprint HDR1X18_2.54_180
footprint HDR1X18_2.54_180F (Footprint not found)
pins: 1, 2, 3, 4, 5, 6, 7, 8, 9, 10, 11, 12, 13, 14, 15, 16, 17, 18

## HDR1x18_2.54T
designator P?, comment HDR1x18  (value not drawn)
Header; PartNumber: HDR1x18_2.54T; Package: HDR1x18_2.54T
footprint HDR1X18_2.54_90 (Footprint not found)
footprint HDR1X18_2.54_90F (Footprint not found)
footprint HDR1X18_2.54_180
footprint HDR1X18_2.54_180F (Footprint not found)
pins: 1, 2, 3, 4, 5, 6, 7, 8, 9, 10, 11, 12, 13, 14, 15, 16, 17, 18

## HDR1x20_1.27
designator P?, comment HDR1x20  (value not drawn)
Header; PartNumber: HDR1x20_1.27; Package: HDR1x20_1.27
footprint HDR1X20_1.27_90 (Footprint not found)
footprint HDR1X20_1.27_90F (Footprint not found)
footprint HDR1X20_1.27_180 (Footprint not found)
footprint HDR1X20_1.27_180F
footprint HDR1X20_1.27_180H (Footprint not found)
pins: 1, 2, 3, 4, 5, 6, 7, 8, 9, 10, 11, 12, 13, 14, 15, 16, 17, 18, 19, 20

## HDR1x20_1.27T
designator P?, comment HDR1x20  (value not drawn)
Header; PartNumber: HDR1x20_1.27T; Package: HDR1x20_1.27T
footprint HDR1X20_1.27_90 (Footprint not found)
footprint HDR1X20_1.27_90F (Footprint not found)
footprint HDR1X20_1.27_180 (Footprint not found)
footprint HDR1X20_1.27_180F
footprint HDR1X20_1.27_180H (Footprint not found)
pins: 1, 2, 3, 4, 5, 6, 7, 8, 9, 10, 11, 12, 13, 14, 15, 16, 17, 18, 19, 20

## HDR1x20_2.54
designator P?, comment HDR1x20  (value not drawn)
Header; PartNumber: HDR1x20_2.54; Package: HDR1x20_2.54
footprint HDR1X20_2.54_90 (Footprint not found)
footprint HDR1X20_2.54_90F (Footprint not found)
footprint HDR1X20_2.54_180
footprint HDR1X20_2.54_180F (Footprint not found)
footprint HDR1X20_2.54_180H
pins: 1, 2, 3, 4, 5, 6, 7, 8, 9, 10, 11, 12, 13, 14, 15, 16, 17, 18, 19, 20

## HDR1x20_2.54T
designator P?, comment HDR1x20  (value not drawn)
Header; PartNumber: HDR1x20_2.54T; Package: HDR1x20_2.54T
footprint HDR1X20_2.54_90 (Footprint not found)
footprint HDR1X20_2.54_90F (Footprint not found)
footprint HDR1X20_2.54_180
footprint HDR1X20_2.54_180F (Footprint not found)
footprint HDR1X20_2.54_180H
pins: 1, 2, 3, 4, 5, 6, 7, 8, 9, 10, 11, 12, 13, 14, 15, 16, 17, 18, 19, 20

## HDR2x1_1.27
designator P?, comment HDR2x1  (value not drawn)
Header; PartNumber: HDR2x1_1.27; Package: HDR2x1_1.27
footprint HDR1X2_1.27_180
footprint HDR1X2_1.27_180H
pins: 1, 2

## HDR2x1_2.54
designator P?, comment HDR2x1  (value not drawn)
Header; PartNumber: HDR2x1_2.54; Package: HDR2x1_2.54
footprint HDR1X2_2.54_90
footprint HDR1X2_2.54_90F
footprint HDR1X2_2.54_180
footprint HDR1X2_2.54_180F
footprint HDR1X2_2.54_180H
footprint HDR1X2_2.54_180HD
pins: 1, 2

## HDR2x2_2.54
designator P?, comment HDR2x2  (value not drawn)
Header; PartNumber: HDR2x2_2.54; Package: HDR2x2_2.54
footprint HDR2X2_2.54_90
footprint HDR2X2_2.54_90F
footprint HDR2X2_2.54_180
footprint HDR2X2_2.54_180F
footprint HDR2X2_2.54_180H
pins: 1, 2, 3, 4

## HDR2x3_2.54
designator P?, comment HDR2x3  (value not drawn)
Header; PartNumber: HDR2x3_2.54; Package: HDR2x3_2.54
footprint HDR2X3_2.54_90
footprint HDR2X3_2.54_90F
footprint HDR2X3_2.54_180
footprint HDR2X3_2.54_180F
footprint HDR2X3_2.54_180H
pins: 1, 2, 3, 4, 5, 6

## HDR2x4_2.54
designator P?, comment HDR2x4  (value not drawn)
Header; PartNumber: HDR2x4_2.54; Package: HDR2x4_2.54
footprint HDR2X4_2.54_90
footprint HDR2X4_2.54_90F (Footprint not found)
footprint HDR2X4_2.54_180
footprint HDR2X4_2.54_180F
footprint HDR2X4_2.54_180H
footprint HDR2X4_2.54_180HF
pins: 1, 2, 3, 4, 5, 6, 7, 8

## HDR2x5_1.27
designator P?, comment HDR2x5  (value not drawn)
Header; PartNumber: HDR2x5_1.27; Package: HDR2x5_1.27
footprint HDR2X5_1.27_90 (Footprint not found)
footprint HDR2X5_1.27_90F (Footprint not found)
footprint HDR2X5_1.27_180HF (Footprint not found)
footprint HDR2X5_1.27_180F (Footprint not found)
footprint HDR2X5_1.27_180H (Footprint not found)
footprint HDR2X5_1.27_180S
footprint HDR2X5_1.27_180FS (Footprint not found)
pins: 1, 2, 3, 4, 5, 6, 7, 8, 9, 10

## HDR2x5_2.54
designator P?, comment HDR2x5  (value not drawn)
Header; PartNumber: HDR2x5_2.54; Package: HDR2x5_2.54
footprint HDR2X5_2.54_90 (Footprint not found)
footprint HDR2X5_2.54_90F (Footprint not found)
footprint HDR2X5_2.54_180
footprint HDR2X5_2.54_180F
footprint HDR2X5_2.54_180HF (Footprint not found)
pins: 1, 2, 3, 4, 5, 6, 7, 8, 9, 10

## HDR2x6_1.27
designator P?, comment HDR2x6  (value not drawn)
Header; PartNumber: HDR2x6_1.27; Package: HDR2x6_1.27
footprint HDR2X6_1.27_90 (Footprint not found)
footprint HDR2X6_1.27_90F (Footprint not found)
footprint HDR2X6_1.27_180HF
footprint HDR2X6_1.27_180F (Footprint not found)
footprint HDR2X6_1.27_180HF
pins: 1, 2, 3, 4, 5, 6, 7, 8, 9, 10, 11, 12

## HDR2x8_2.54
designator P?, comment HDR2x8  (value not drawn)
Header; PartNumber: HDR2x8_2.54; Package: HDR2x8_2.54
footprint HDR2X8_2.54_90
footprint HDR2X8_2.54_90F
footprint HDR2X8_2.54_180
footprint HDR2X8_2.54_180F
footprint HDR2X8_2.54_180HF
footprint HDR2X8_2.54_180H
pins: 1, 2, 3, 4, 5, 6, 7, 8, 9, 10, 11, 12, 13, 14, 15, 16

## HDR2x10_1.27
designator P?, comment HDR2x10  (value not drawn)
Header; PartNumber: HDR2x10_1.27; Package: HDR2x10_1.27
footprint HDR2X10_1.27_90 (Footprint not found)
footprint HDR2X10_1.27_90F (Footprint not found)
footprint HDR2X10_1.27_180HF (Footprint not found)
footprint HDR2X10_1.27_180F (Footprint not found)
footprint HDR2X10_1.27_180H (Footprint not found)
footprint HDR2X10_1.27_180 (Footprint not found)
footprint HDR2X10_1.27_180S
footprint HDR2X10_1.27_180FS
footprint HDR2X10_1.27_180TBH
pins: 1, 2, 3, 4, 5, 6, 7, 8, 9, 10, 11, 12, 13, 14, 15, 16, 17, 18, 19, 20

## HDR2x10_2.54
designator P?, comment HDR2x10  (value not drawn)
Header; PartNumber: HDR2x10_2.54; Package: HDR2x10_2.54
footprint HDR2X10_2.54_90
footprint HDR2X10_2.54_90F
footprint HDR2X10_2.54_180
footprint HDR2X10_2.54_180F
footprint HDR2X10_2.54_180HF
footprint HDR2X10_2.54_180H
pins: 1, 2, 3, 4, 5, 6, 7, 8, 9, 10, 11, 12, 13, 14, 15, 16, 17, 18, 19, 20

## HDR2x12_1.27
designator P?, comment HDR2x12  (value not drawn)
Header; PartNumber: HDR2x12_1.27; Package: HDR2x12_1.27
footprint HDR2X12_1.27_90 (Footprint not found)
footprint HDR2X12_1.27_90F (Footprint not found)
footprint HDR2X12_1.27_180HF
footprint HDR2X12_1.27_180F (Footprint not found)
footprint HDR2X12_1.27_180HF
pins: 1, 2, 3, 4, 5, 6, 7, 8, 9, 10, 11, 12, 13, 14, 15, 16, 17, 18, 19, 20, 21, 22, 23, 24

## HDR2x12_2.54
designator P?, comment HDR2x12  (value not drawn)
Header; PartNumber: HDR2x12_2.54; Package: HDR2x12_2.54
footprint HDR2X12_2.54_90 (Footprint not found)
footprint HDR2X12_2.54_90F (Footprint not found)
footprint HDR2X12_2.54_180 (Footprint not found)
footprint HDR2X12_2.54_180F
footprint HDR2X12_2.54_180HF
pins: 1, 2, 3, 4, 5, 6, 7, 8, 9, 10, 11, 12, 13, 14, 15, 16, 17, 18, 19, 20, 21, 22, 23, 24